# Altium footprint library Active.PcbLib: 308 footprints (part 16 of 22)
Each footprint in its own frame and in the unit in brackets; x right, y up, seen from the top. Pads: shape width x height; smd on the part's side, far side on the other; paste and mask are expansions set on the pad; w line width, h text height; cw(c..) or ccw(c..) is an arc to the next point about the centre after c.
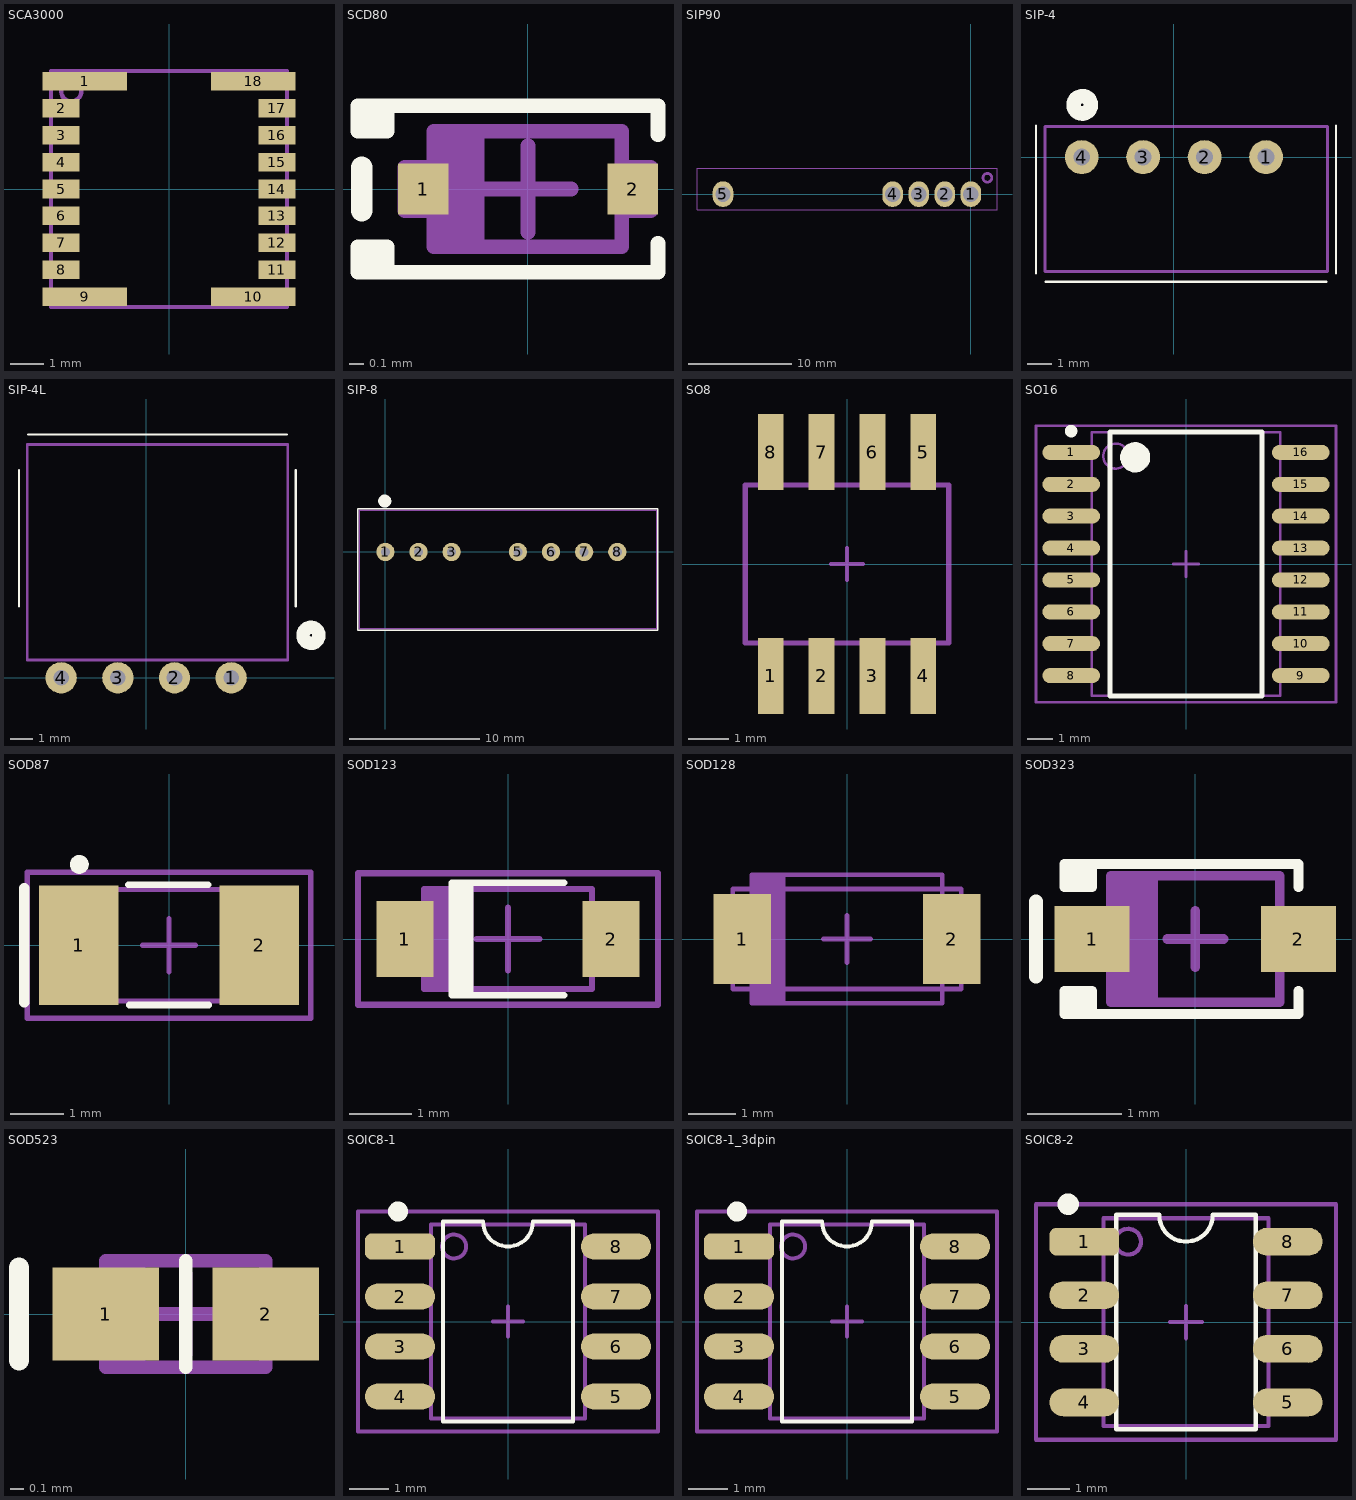
[diagram p15: the footprints below, top view; thin cyan lines are the x and y axes]

## SCA3000 [mm] "18pin 3-axis accelerometer"
height 1.8
pads (18):
  rect 2.5x0.55 smd mask+0.051: 1(-2.5,3.2) 9(-2.5,-3.2) 10(2.5,-3.2) 18(2.5,3.2)
  rect 1.1x0.55 smd mask+0.051: 2(-3.2,2.4) 3(-3.2,1.6) 4(-3.2,0.8) 5(-3.2,0) 6(-3.2,-0.8) 7(-3.2,-1.6) 8(-3.2,-2.4) 11(3.2,-2.4) 12(3.2,-1.6) 13(3.2,-0.8) 14(3.2,0) 15(3.2,0.8) 16(3.2,1.6) 17(3.2,2.4)
Mechanical 13:
  circle w0.127: c-2.9,2.9 r0.3
  lines w0.127: 3.5,-3.5 -3.5,-3.5 -3.5,3.5 3.5,3.5 ; 3.5,-3.5 3.5,3.5 ; 3.5,-3.5 3.5,3.5
3D body: height 1.8, standoff 0, extent -3.5,-3.5 3.5,3.5

## SCD80 [mm] "SCD80 diode"
height 0.7
pads (2):
  rect 0.35x0.35 smd: 1(-0.725,0) 2(0.725,0)
Top Overlay:
  lines w0.102: -1.1,-0.575 0.9,-0.575 ; -1.1,0.575 0.9,0.575 ; -1.075,-0.4 -1.075,-0.575 -0.975,-0.575 -0.975,-0.4 -1.175,-0.4 -1.175,-0.575 -0.85,-0.575 ; -1.075,0.4 -1.075,0.575 -0.975,0.575 -0.975,0.4 -1.175,0.4 -1.175,0.575 -0.85,0.575 ; 0.9,-0.55 0.9,-0.375 ; 0.9,0.375 0.9,0.55
  lines w0.15: -1.15,-0.15 -1.15,0.15
Mechanical 13:
  lines w0.102: -0.65,-0.15 -0.85,-0.15 -0.85,0.15 -0.65,0.15 ; -0.55,-0.4 -0.55,0.4 ; -0.45,-0.4 -0.45,0.4 ; -0.35,-0.4 -0.35,0.4 ; 0.65,-0.15 0.85,-0.15 0.85,0.15 0.65,0.15 ; -0.65,-0.4 -0.65,0 -0.65,0.4 0.65,0.4 0.65,-0.4 -0.65,-0.4
Mechanical 15:
  lines w0.102: -0.3,0 0.3,0 ; 0,-0.3 0,0.3
3D body: height 0.13, standoff 0, extent 0.65,-0.15 0.85,0.15
3D body: height 0.7, standoff 0, extent -0.65,-0.4 0.65,0.4
3D body: height 0.71, standoff 0.7, extent -0.65,-0.4 -0.35,0.4
3D body: height 0.13, standoff 0, extent -0.85,-0.15 -0.65,0.15

## SIP90 [mm] "SIP90 Emco HV Power supply"
height 13.97
pads (5):
  oval 2x2.5 hole 1.5: 1(0,0) 2(-2.54,0) 3(-5.08,0) 4(-7.62,0) 5(-24.13,0)
Mechanical 13:
  circle w0.254: c1.6,1.6 r0.424
  lines w0.1: -26.66,-1.52 -26.66,2.54 2.54,2.54 2.54,-1.52 -26.66,-1.52
3D body: height 13.97, standoff 0, extent -26.66,-1.52 2.54,2.54
3D body: height 13.98, standoff 13.97, extent 1.104,1.101 2.1,2.099
3D body: height 0, standoff -5, extent -24.7,-0.3 -23.5,0.4
3D body: height 0, standoff -5, extent -8.19,-0.3 -6.99,0.4
3D body: height 0, standoff -5, extent -5.65,-0.3 -4.45,0.4
3D body: height 0, standoff -5, extent -3.11,-0.3 -1.91,0.4
3D body: height 0, standoff -5, extent -0.57,-0.3 0.63,0.4

## SIP-4 [mm] "SIP 4 pin, Body 11.68x6.0x9.65mm (LxWxH), Pitch 2,54mm"
height 9.65
pads (4):
  round 1.4 hole 0.7: 1(3.81,0) 2(1.27,0) 3(-1.27,0) 4(-3.81,0)
Top Overlay:
  circle w0.6: c-3.788,2.159 r0.359
  lines w0.102: -5.7,-4.8 -5.7,1.3 ; -5.301,-5.156 6.299,-5.156 ; 6.7,-4.8 6.7,1.3
Mechanical 13:
  lines w0.127: -5.33,-4.73 6.35,-4.73 6.35,1.27 -5.33,1.27 -5.33,-4.73
3D body: height 9.65, standoff 0, extent -5.33,-4.73 6.35,1.27
3D body: height 0, standoff -3.8, extent -4.12,-0.2 -3.52,0.2
3D body: height 0, standoff -3.8, extent -1.58,-0.2 -0.98,0.2
3D body: height 0, standoff -3.8, extent 0.96,-0.2 1.56,0.2
3D body: height 0, standoff -3.8, extent 3.5,-0.2 4.1,0.2
3D body: height 9.65, standoff 9.65, extent 3.087,-0.696 4.499,0.716

## SIP-4L [mm] "SIP 4 pin, Body 11.68x6.0x9.65mm (LxWxH), Pitch 2,54mm"
height 6
pads (4):
  round 1.4 hole 0.7: 1(3.81,0) 2(1.27,0) 3(-1.27,0) 4(-3.81,0)
Top Overlay:
  circle w0.6: c7.388,1.905 r0.359
  lines w0.102: -5.7,3.2 -5.7,9.3 ; -5.3,10.9 6.3,10.9 ; 6.7,3.2 6.7,9.3
Mechanical 13:
  lines w0.127: -5.33,0.8 -5.33,10.45 6.35,10.45 6.35,0.8 -5.33,0.8
3D body: height 6.01, standoff 6, extent -4.492,1.1 -3.08,2.512
3D body: height 6, standoff 0, extent -5.33,0.8 6.35,10.45
3D body: height 0.8, standoff 0, extent 3.5,-0.2 4.1,0.2
3D body: height 0.8, standoff 0, extent 0.96,-0.2 1.56,0.2
3D body: height 0.8, standoff 0, extent -1.58,-0.2 -0.98,0.2
3D body: height 0.8, standoff 0, extent -4.12,-0.2 -3.52,0.2
3D body: height 1.27, standoff 0.8, extent 3.5,-0.2 4.1,0.8
3D body: height 1.27, standoff 0.8, extent 0.96,-0.2 1.56,0.8
3D body: height 1.27, standoff 0.8, extent -1.58,-0.2 -0.98,0.8
3D body: height 1.27, standoff 0.8, extent -4.12,-0.2 -3.52,0.8

## SIP-8 [mm] "SIP 8pin, Body 21.8x9.2x11.1mm (LxWxH), R2,54mm"
height 11.1
pads (7):
  round 1.4 hole 0.7: 1(0,0) 2(2.54,0) 3(5.08,0) 5(10.16,0) 6(12.7,0) 7(15.24,0) 8(17.78,0)
Top Overlay:
  circle w0.5: c-0.05,3.9 r0.25
  lines w0.102: -2.1,-6 20.9,-6 20.9,3.3 -2.1,3.3 -2.1,-6
Mechanical 13:
  lines w0.127: -2,-5.9 20.8,-5.9 20.8,3.2 -2,3.2 -2,-5.9
3D body: height 0.6, standoff 0, extent 20.3,-5.9 20.8,3.2
3D body: height 11.1, standoff 0.5, extent -2,-5.9 20.8,3.2
3D body: height 0.6, standoff 0, extent -2,-5.9 -1.5,3.2
3D body: height 0, standoff -3.8, extent 4.79,-0.2 5.39,0.2
3D body: height 0, standoff -3.8, extent 2.25,-0.2 2.85,0.2
3D body: height 0, standoff -3.8, extent -0.29,-0.2 0.31,0.2
3D body: height 11.15, standoff 11.1, extent -0.689,-0.716 0.723,0.696
3D body: height 0, standoff -3.8, extent 9.87,-0.2 10.47,0.2
3D body: height 0, standoff -3.8, extent 12.41,-0.2 13.01,0.2
3D body: height 0, standoff -3.8, extent 14.95,-0.2 15.55,0.2
3D body: height 0, standoff -3.8, extent 17.49,-0.2 18.09,0.2

## SO8 [mm]
height 0.081
pads (8):
  rect 0.64x1.9 smd: 1(-1.905,-2.795) 2(-0.635,-2.795) 3(0.635,-2.795) 4(1.905,-2.795) 5(1.905,2.795) 6(0.635,2.795) 7(-0.635,2.795) 8(-1.905,2.795)
Mechanical 13:
  lines w0.127: -2.54,-1.968 2.54,-1.968 2.54,1.968 -2.54,1.968 -2.54,-1.968
Mechanical 15:
  lines w0.102: -0.4,0 0.4,0 ; 0,-0.4 0,0.4
3D body: height 3.17, standoff 0, extent -2.54,-1.968 2.54,1.968
3D body: height 3.18, standoff 3.17, extent -2.308,-1.408 -1.492,-0.592
3D body: height 3.18, standoff 3.17, extent -2.54,-1.968 2.54,-1.7
3D body: height 1, standoff 0, extent 1.71,-3.3 2.11,-1.968
3D body: height 1, standoff 0, extent 0.44,-3.3 0.84,-1.968
3D body: height 1, standoff 0, extent -0.83,-3.3 -0.43,-1.968
3D body: height 1, standoff 0, extent -2.1,-3.3 -1.7,-1.968
3D body: height 1, standoff 0, extent 1.71,1.968 2.11,3.3
3D body: height 1, standoff 0, extent 0.44,1.968 0.84,3.3
3D body: height 1, standoff 0, extent -0.83,1.968 -0.43,3.3
3D body: height 1, standoff 0, extent -2.1,1.968 -1.7,3.3

## SO16 [mm] "SOIC, 16-Leads, Body 10,5x7,5mm (max), Pitch 1,27mm, IPC Medium Density"
height 2.65
pads (16):
  oval 2.3x0.6 smd: 1(-4.575,4.445) 2(-4.575,3.175) 3(-4.575,1.905) 4(-4.575,0.635) 5(-4.575,-0.635) 6(-4.575,-1.905) 7(-4.575,-3.175) 8(-4.575,-4.445) 9(4.575,-4.445) 10(4.575,-3.175) 11(4.575,-1.905) 12(4.575,-0.635) 13(4.575,0.635) 14(4.575,1.905) 15(4.575,3.175) 16(4.575,4.445)
Top Overlay:
  circle w0.25: c-4.575,5.295 r0.125
  circle w0.6: c-2.025,4.25 r0.3
  lines w0.2: -3.025,-5.25 -3.025,5.25 3.025,5.25 3.025,-5.25 -3.025,-5.25
Mechanical 13:
  circle w0.1: c-2.8,4.3 r0.5
  lines w0.1: -3.75,-5.25 -3.75,5.25 3.75,5.25 3.75,-5.25 -3.75,-5.25
Mechanical 15:
  lines w0.1: -0.5,0 0.5,0 ; 0,-0.5 0,0.5 ; -5.975,-5.5 -5.975,5.5 5.975,5.5 5.975,-5.5 -5.975,-5.5
3D body: height 2.65, standoff 0.1, extent -3.75,-5.25 3.75,5.25

## SOD87 [mm] "MELF Diode, 2-Leads, Body 3,5x2,0mm"
height 2.1
pads (2):
  rect 1.5x2.25 smd: 1(-1.7,0) 2(1.7,0)
Top Overlay:
  circle w0.178: c-1.689,1.524 r0.089
  lines w0.127: -0.762,1.143 0.738,1.143 ; -0.75,-1.125 0.75,-1.125
  lines w0.2: -2.725,-1.075 -2.725,1.075
Mechanical 13:
  rectangle: -1.85,-1.05 -1.352,1.05
  lines w0.1: -1.85,-1.05 -1.85,1.05 1.85,1.05 1.85,-1.05 -1.85,-1.05
Mechanical 15:
  lines w0.1: -0.5,0 0.5,0 ; 0,-0.5 0,0.5 ; -2.667,-1.375 -2.667,1.375 2.667,1.375 2.667,-1.375 -2.667,-1.375
3D body: height 2.14, standoff 0.05, extent -0.8,-1.048 1.6,1.048
3D body: height 2.14, standoff 0.05, extent -1.2,-1.048 -0.8,1.048
3D body: height 2.14, standoff 0.05, extent -1.6,-1.048 -1.2,1.048
3D body: height 2.19, standoff 0, extent -1.85,-1.098 -1.6,1.098
3D body: height 2.19, standoff 0, extent 1.6,-1.098 1.85,1.098

## SOD123 [mm] "2-Leads, Body 1,6x2,7mm (max), IPC Medium Density"
height 1.35
pads (2):
  rect 0.91x1.22 smd: 1(-1.65,0) 2(1.65,0)
Top Overlay:
  lines w0.102: -0.8,-0.9 -0.8,0.9 ; -0.7,-0.9 -0.7,0.9 ; -0.6,-0.9 -0.6,0.9 ; 0.9,-0.9 -0.9,-0.9 -0.9,0.9 0.9,0.9
Mechanical 13:
  rectangle: -1.345,-0.8 -0.55,0.8
  lines w0.1: -1.345,-0.8 1.345,-0.8 1.345,0.8 -1.345,0.8 -1.345,-0.8
Mechanical 15:
  lines w0.1: -0.5,0 0.5,0 ; 0,-0.5 0,0.5 ; -2.4,-1.05 2.4,-1.05 2.4,1.05 -2.4,1.05 -2.4,-1.05
3D body: height 1.35, standoff 0.05, extent -1.345,-0.8 1.345,0.8
3D body: height 1.36, standoff 1.35, extent -1.345,-0.8 -0.575,0.8

## SOD128 [mm] "2-Leads, Body 2.7x4.0mm (max), IPC Medium Density"
height 1.1
pads (2):
  rect 1.2x1.9 smd: 1(-2.2,0) 2(2.2,0)
Mechanical 13:
  region: -2,-1.35 -2,1.35 -1.3,1.35 -1.3,-1.35
  lines w0.1: -2,-1.35 -2,1.35 2,1.35 2,-1.35 -2,-1.35
Mechanical 15:
  lines w0.1: -0.5,0 0.5,0 ; 0,-0.5 0,0.5 ; -2.4,-1.05 -2.4,1.05 2.4,1.05 2.4,-1.05 -2.4,-1.05
3D body: height 1.1, standoff 0, extent -1.3,-1.35 2,1.35
3D body: height 1.1, standoff 0, extent -2,-1.35 -1.3,1.35

## SOD323 [mm] "SOD323 diode"
height 1.1
pads (2):
  rect 0.8x0.7 smd: 1(-1.1,0) 2(1.1,0)
Top Overlay:
  lines w0.102: -1.075,-0.8 -1.4,-0.8 -1.4,-0.55 ; -1.075,0.8 -1.4,0.8 -1.4,0.55 ; 1.1,-0.55 1.1,-0.8 -1.1,-0.8 -1.1,-0.55 ; 1.1,0.55 1.1,0.8 -1.1,0.8 -1.1,0.55 ; -1.4,-0.55 -1.3,-0.55 -1.3,-0.8 -1.2,-0.8 -1.2,-0.55 -1.1,-0.55 ; -1.4,-0.55 -1.1,-0.55 ; -1.4,0.55 -1.1,0.55 ; -1.4,0.55 -1.3,0.55 -1.3,0.8 -1.2,0.8 -1.2,0.55 -1.1,0.55
  lines w0.15: -1.7,-0.4 -1.7,0.4
Mechanical 13:
  region: -0.4,0.675 -0.9,0.675 -0.9,-0.675 -0.4,-0.675
  lines w0.102: -0.925,-0.2 -1.325,-0.2 -1.325,0.2 -0.9,0.2 ; 0.9,0.2 1.325,0.2 1.325,-0.2 0.925,-0.2 ; -0.9,-0.675 0.9,-0.675 0.9,0.675 -0.9,0.675 -0.9,0 -0.9,-0.675
Mechanical 15:
  lines w0.102: -0.3,0 0.3,0 ; 0,-0.3 0,0.3
3D body: height 1.1, standoff 0, extent -0.9,-0.675 0.9,0.675
3D body: height 0.4, standoff 0, extent -1.325,-0.2 -0.9,0.2
3D body: height 0.4, standoff 0, extent 0.9,-0.2 1.325,0.2
3D body: height 1.11, standoff 1.1, extent -0.9,-0.675 -0.4,0.675

## SOD523 [mm] "SOD523 diode"
height 0.65
pads (2):
  rect 0.8x0.7 smd: 1(-0.6,0) 2(0.6,0)
Top Overlay:
  lines w0.102: 0,-0.4 0,0.4
  lines w0.15: -1.25,-0.35 -1.25,0.35
Mechanical 13:
  rectangle: -0.6,-0.4 -0.3,0.4
  lines w0.102: -0.6,-0.2 -0.825,-0.2 -0.825,0.2 -0.6,0.2 ; 0.6,-0.2 0.825,-0.2 0.825,0.2 0.6,0.2 ; -0.6,-0.4 -0.6,0.4 0.6,0.4 0.6,-0.4 -0.6,-0.4
Mechanical 15:
  lines w0.102: -0.3,0 0.3,0 ; 0,-0.3 0,0.3
3D body: height 0.65, standoff 0.65, extent -0.6,-0.4 -0.3,0.4
3D body: height 0.15, standoff 0, extent -0.825,-0.2 -0.6,0.2
3D body: height 0.15, standoff 0, extent 0.6,-0.2 0.825,0.2
3D body: height 0.65, standoff 0, extent -0.6,-0.4 0.6,0.4

## SOIC8-1 [mil]
pads (8):
  rrect50% 70x26 smd: 1(-108,75)
  oval 70x26 smd: 2(-108,25) 3(-108,-25) 4(-108,-75) 5(108,-75) 6(108,-25) 7(108,25) 8(108,75)
Top Overlay:
  circle w10: c-110,110 r5
  lines w4: -65,-100 65,-100 ; -65,-100 -65,100 ; -65,-100 -65,100 ; -65,100 -25,100 ccw(c0,100) 25,100 65,100 ; 65,-100 65,100 ; 65,-100 65,100
Mechanical 13:
  circle w4: c-54,75 r12
  lines w4: -77,-97 -77,97 77,97 77,-97 -77,-97
Mechanical 15:
  lines w4: -15,0 15,0 ; 0,-15 0,15 ; -150,-110 150,-110 150,110 -150,110 -150,-110
3D body: height 74.8, standoff 0, extent -77,-97 77,97
3D body: height 75.2, standoff 74.8, extent -66.24,62.76 -41.76,87.24

## SOIC8-1_3dpin [mil]
pads (8):
  rrect50% 70x26 smd: 1(-108,75)
  oval 70x26 smd: 2(-108,25) 3(-108,-25) 4(-108,-75) 5(108,-75) 6(108,-25) 7(108,25) 8(108,75)
Top Overlay:
  circle w10: c-110,110 r5
  lines w4: -65,-100 -65,100 ; -65,-100 -65,100 ; -65,-100 65,-100 ; -65,100 -25,100 ccw(c0,100) 25,100 65,100 ; 65,-100 65,100 ; 65,-100 65,100
Mechanical 13:
  circle w4: c-54,75 r12
  lines w4: -77,-97 77,-97 77,97 -77,97 -77,-97
Mechanical 15:
  lines w4: -15,0 15,0 ; 0,-15 0,15 ; -150,-110 -150,110 150,110 150,-110 -150,-110
3D body: height 35.43, standoff 27.56, extent 76.77,66.34 104.33,84.06
3D body: height 27.56, standoff 0, extent 96.46,66.34 104.33,84.06
3D body: height 7.87, standoff 0, extent 96.46,66.34 120.08,84.06
3D body: height 35.43, standoff 27.56, extent 76.77,16.34 104.33,34.06
3D body: height 27.56, standoff 0, extent 96.46,16.34 104.33,34.06
3D body: height 7.87, standoff 0, extent 96.46,16.34 120.08,34.06
3D body: height 35.43, standoff 27.56, extent 76.77,-33.66 104.33,-15.94
3D body: height 27.56, standoff 0, extent 96.46,-33.66 104.33,-15.94
3D body: height 7.87, standoff 0, extent 96.46,-33.66 120.08,-15.94
3D body: height 35.43, standoff 27.56, extent 76.77,-83.66 104.33,-65.94
3D body: height 27.56, standoff 0, extent 96.46,-83.66 104.33,-65.94
3D body: height 7.87, standoff 0, extent 96.46,-83.66 120.08,-65.94
3D body: height 35.43, standoff 27.56, extent -104.33,-84.06 -76.77,-66.34
3D body: height 27.56, standoff 0, extent -104.33,-84.06 -96.46,-66.34
3D body: height 7.87, standoff 0, extent -120.08,-84.06 -96.46,-66.34
3D body: height 35.43, standoff 27.56, extent -104.33,-34.06 -76.77,-16.34
3D body: height 27.56, standoff 0, extent -104.33,-34.06 -96.46,-16.34
3D body: height 7.87, standoff 0, extent -120.08,-34.06 -96.46,-16.34
3D body: height 35.43, standoff 27.56, extent -104.33,15.94 -76.77,33.66
3D body: height 27.56, standoff 0, extent -104.33,15.94 -96.46,33.66
3D body: height 7.87, standoff 0, extent -120.08,15.94 -96.46,33.66
3D body: height 7.87, standoff 0, extent -120.08,65.94 -96.46,83.66
3D body: height 27.56, standoff 0, extent -104.33,65.94 -96.46,83.66
3D body: height 62.99, standoff 0, extent -77,-97 77,97
3D body: height 63.39, standoff 62.99, extent -65.85,63.02 -42.32,86.59
3D body: height 35.43, standoff 27.56, extent -104.33,65.94 -76.77,83.66

## SOIC8-2 [mil] "SOIC8 R1.27mm narrow"
pads (8):
  rrect50% 65x26 smd: 1(-95,75)
  oval 65x26 smd: 2(-95,25) 3(-95,-25) 4(-95,-75) 5(95,-75) 6(95,-25) 7(95,25) 8(95,75)
Top Overlay:
  circle w10: c-110,110 r5
  lines w4: -65,-100 65,-100 ; -65,-100 -65,100 ; -65,-100 -65,100 ; -65,100 -25,100 ccw(c0,100) 25,100 65,100 ; 65,-100 65,100 ; 65,-100 65,100
Mechanical 13:
  circle w4: c-54,75 r12
  lines w4: -77,-97 -77,97 77,97 77,-97 -77,-97
Mechanical 15:
  lines w4: -15,0 15,0 ; 0,-15 0,15 ; -140,-110 140,-110 140,110 -140,110 -140,-110
3D body: height 74.8, standoff 0, extent -77,-97 77,97
3D body: height 75.2, standoff 74.8, extent -66.24,62.76 -41.76,87.24